# Altium footprint library Connectors.PcbLib: 408 footprints (part 6 of 26)
Each footprint in its own frame and in the unit in brackets; x right, y up, seen from the top. Pads: shape width x height; smd on the part's side, far side on the other; paste and mask are expansions set on the pad; w line width, h text height; cw(c..) or ccw(c..) is an arc to the next point about the centre after c.
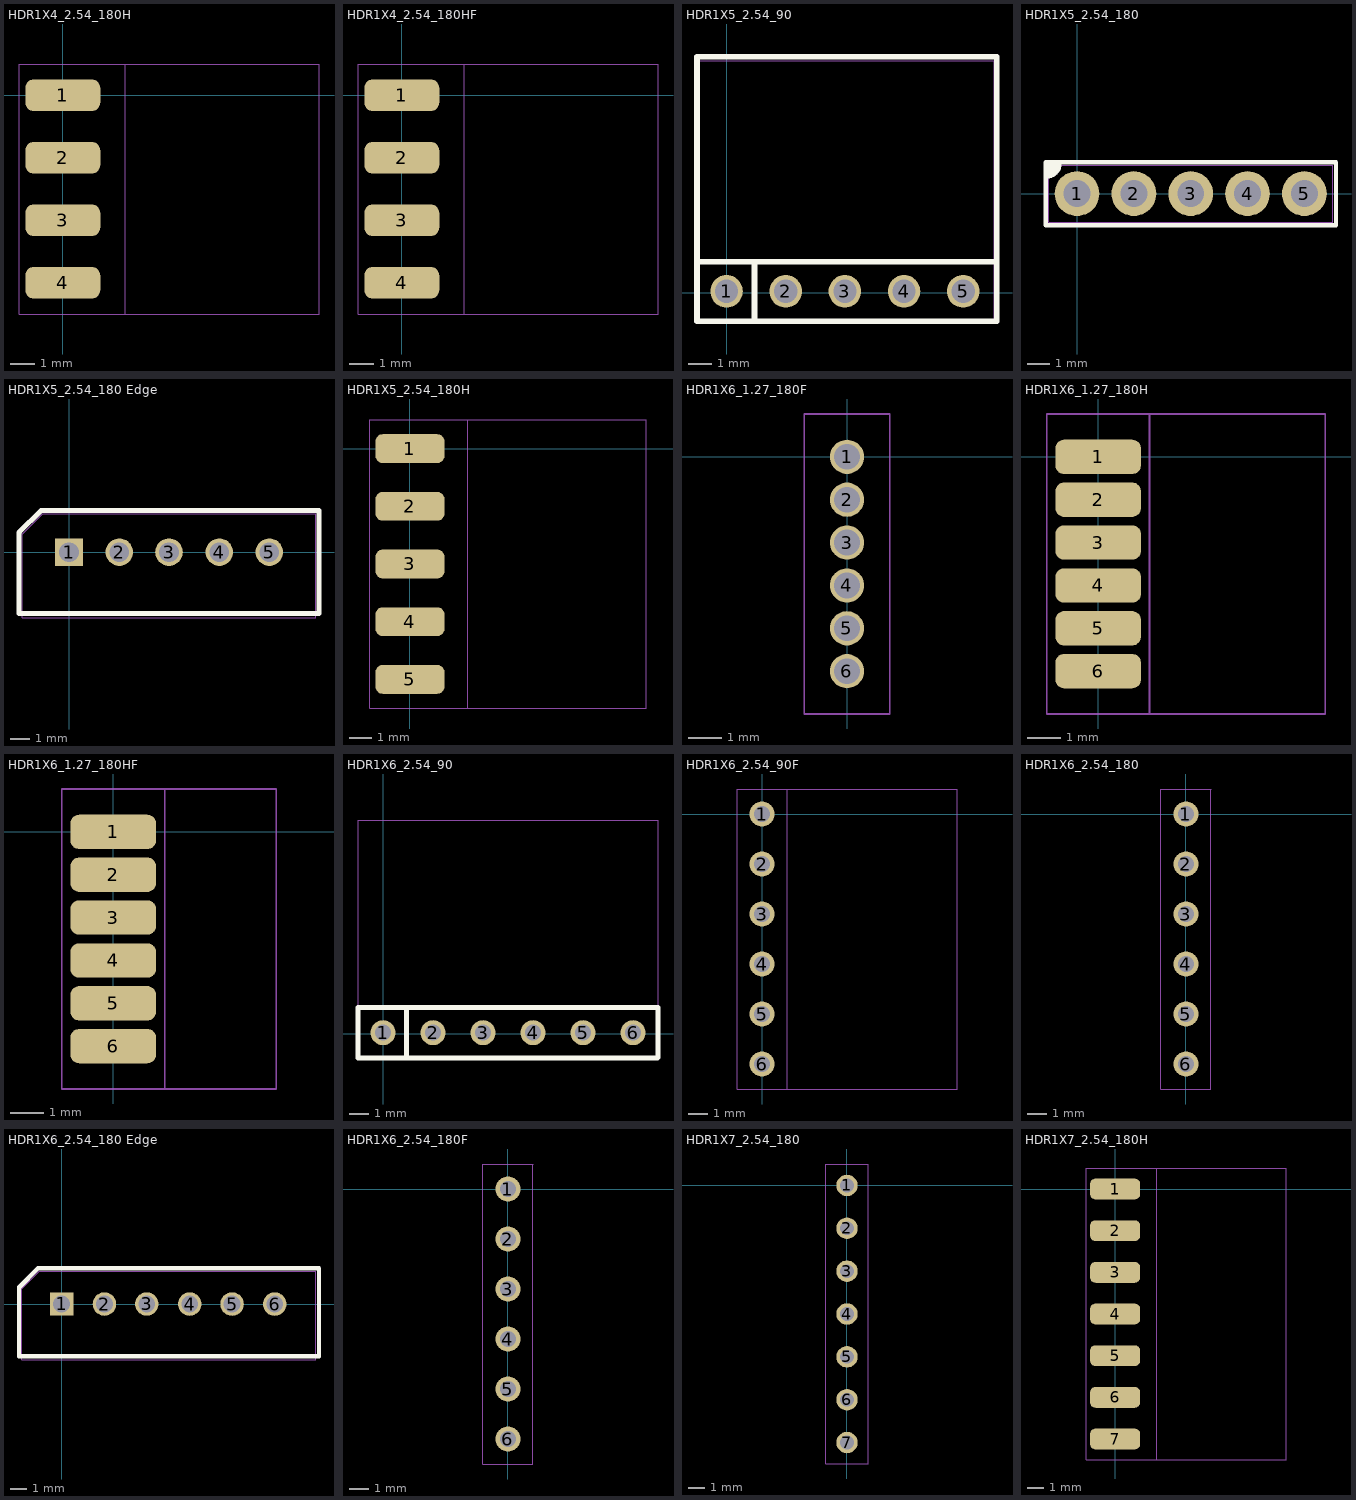
[diagram p5: the footprints below, top view; thin cyan lines are the x and y axes]

## HDR1X4_2.54_180H [mil]
height 169.29
pads (4):
  rrect50% 120x50 smd: 1(0,0) 2(0,-100) 3(0,-200) 4(0,-300)
Mechanical 13:
  lines w2: -70,-350 410,-350 410,50 -70,50 -70,-350
Mechanical 14:
  lines w2: -70,-350 -70,50 100,50 100,-350 -70,-350
  text ".Designator" at -31,-170 h80
3D body "pin_header_aw140-eg-g04d.stp": height 61.32, standoff -37.05, extent -35,-350 405.94,50

## HDR1X4_2.54_180HF [mil]
height 169.29
pads (4):
  rrect50% 120x50 smd: 1(0,0) 2(0,-100) 3(0,-200) 4(0,-300)
Mechanical 13:
  lines w2: -70,-350 -70,50 410,50 410,-350 -70,-350
Mechanical 14:
  lines w2: -70,-350 100,-350 100,50 -70,50 -70,-350
  text ".Designator" at -31,-170 h80

## HDR1X5_2.54_90 [mm]
height 4.3
pads (5):
  round 1.4 hole 1: 1(-0.015,0.053) 2(2.525,0.053) 3(5.065,0.053) 4(7.605,0.053) 5(10.145,0.053)
Top Overlay:
  lines w0.254: 1.183,-1.212 1.183,1.317 ; -1.282,1.316 -1.282,10.124 11.584,10.124 11.584,1.322 ; -1.282,1.316 -1.282,-1.234 11.584,-1.234 11.584,1.322 ; -1.282,1.316 -1.276,1.322 11.584,1.322
Mechanical 13:
  lines w0.051: -1.285,-1.217 -1.285,9.946 11.479,9.946 11.479,-1.217 -1.285,-1.217
Mechanical 14:
  lines w0.051: -1.285,-1.217 11.595,-1.217 11.595,1.323 -1.285,1.323 -1.285,-1.217
3D body "User Library-Header_Male_RA_Low_5Pin.STEP": height 3.78, standoff -1.73, extent -1.244,-0.23 11.456,9.9

## HDR1X5_2.54_180 [mm]
height 4.3
pads (5):
  round 2 hole 1.2: 1(0,0) 2(2.54,0) 3(5.08,0) 4(7.62,0) 5(10.16,0)
Top Overlay:
  region: -1.4,1.406 -0.9,1.406 -0.9,1.206 -1.2,0.906 -1.4,0.906
  lines w0.2: -1.4,-1.416 -1.4,1.406 11.573,1.406 11.573,-1.416 -1.4,-1.416
  lines w0.3: -1.334,0.828 ccw(c-1.334,1.328) -0.834,1.328
Mechanical 13:
  lines w0.051: -1.27,-1.27 -1.27,1.27 11.43,1.27 11.43,-1.27 -1.27,-1.27
3D body "pin_header_aw140-eg-g05d.stp": height 8.2, standoff -3, extent -1.27,-1.249 11.43,1.249

## HDR1X5_2.54_180 Edge [mm]
height 4.3
pads (5):
  rect 1.4x1.4 hole 1: 1(-0.014,0.001)
  round 1.4 hole 1: 2(2.54,0) 3(5.066,0.001) 4(7.62,0) 5(10.16,0)
Top Overlay:
  lines w0.254: -2.541,1.006 -1.422,2.125 -1.401,2.125 12.67,2.125 ; -2.554,-3.103 12.686,-3.103 12.686,2.119 -1.428,2.119 -2.554,1.014 -2.554,-3.103
Mechanical 13:
  lines w0.051: -2.385,-3.323 12.51,-3.323 12.51,1.95 -1.355,1.95 -2.385,0.92 -2.385,-3.323
3D body "JST B5B-XH-A.STEP": height 7, standoff -3.4, extent -2.38,-3.203 12.52,2.547

## HDR1X5_2.54_180H [mil]
height 169.29
pads (5):
  rrect50% 120x50 smd: 1(0,0) 2(0,-100) 3(0,-200) 4(0,-300) 5(0,-400)
Mechanical 13:
  lines w2: -70,-450 410,-450 410,50 -70,50 -70,-450
Mechanical 14:
  lines w2: -70,-450 -70,50 100,50 100,-450 -70,-450
  text ".Designator" at -31,-220 h80
3D body "pin_header_aw140-eg-g05d.stp": height 61.32, standoff -37.05, extent -35,-450 405.95,50

## HDR1X6_1.27_180F [mil]
height 169.29
pads (6):
  round 40 hole 30: 1(0,0) 2(0,-50) 3(0,-100) 4(0,-150) 5(0,-200) 6(0,-250)
Mechanical 13:
  lines w2: -50,-300 -50,50 50,50 50,-300 -50,-300
Mechanical 14:
  lines w2: -50,-300 -50,50 50,50 50,-300 -50,-300
  text ".Designator" at -31,-145 h80

## HDR1X6_1.27_180H [mil]
height 169.29
pads (6):
  rrect50% 100x40 smd: 1(0,0) 2(0,-50) 3(0,-100) 4(0,-150) 5(0,-200) 6(0,-250)
Mechanical 13:
  lines w2: -60,-300 -60,50 265,50 265,-300 -60,-300
Mechanical 14:
  lines w2: -60,-300 60,-300 60,50 -60,50 -60,-300
  text ".Designator" at -31,-145 h80
3D body "pin_header_a-sl127-eg-g06d.stp": height 49.21, standoff -49.21, extent -47.36,-274.99 265.24,25.01

## HDR1X6_1.27_180HF [mil]
height 169.29
pads (6):
  rrect50% 100x40 smd: 1(0,0) 2(0,-50) 3(0,-100) 4(0,-150) 5(0,-200) 6(0,-250)
Mechanical 13:
  lines w2: -60,-300 -60,50 190,50 190,-300 -60,-300
Mechanical 14:
  lines w2: -60,-300 60,-300 60,50 -60,50 -60,-300
  text ".Designator" at -31,-145 h80
3D body "female_header_a-bl127-eg-g06d.stp": height 71.43, standoff 0.57, extent -38.35,-282.88 190,32.88

## HDR1X6_2.54_90 [mil]
height 169.29
pads (6):
  round 50 hole 32: 1(-0.59,2.09) 2(99.41,2.09) 3(199.41,2.09) 4(299.41,2.09) 5(399.41,2.09) 6(499.41,2.09)
Top Overlay:
  lines w10: 46.57,-47.72 46.57,51.85 ; -50.47,-48.11 -50.47,51.81 -50.24,52.05 549.37,52.05 549.37,-47.2 548.46,-48.11 -50.47,-48.11
Mechanical 13:
  lines w2: -50.59,-47.91 -50.59,427.09 549.41,427.09 549.41,-47.91 -50.59,-47.91
Mechanical 14:
  lines w2: -50.59,-47.91 549.41,-47.91 549.41,52.09 -50.59,52.09 -50.59,-47.91
3D body "pin_header_aw140-ea-g06g.stp": height 99.21, standoff -93.7, extent -46.66,-12.88 545.47,425.71

## HDR1X6_2.54_90F [mil]
height 169.29
pads (6):
  round 50 hole 32: 1(0,0) 2(0,-100) 3(0,-200) 4(0,-300) 5(0,-400) 6(0,-500)
Mechanical 13:
  lines w2: -50,-550 -50,50 390,50 390,-550 -50,-550
Mechanical 14:
  lines w2: -50,-550 50,-550 50,50 -50,50 -50,-550
  text ".Designator" at -31,-270 h80
3D body "female_header_a-bl254-ea-g06d.stp": height 99.21, standoff -125.2, extent -10,-554.92 386.06,54.92

## HDR1X6_2.54_180 [mil]
height 169.29
pads (6):
  round 50 hole 32: 1(0,0) 2(0,-100) 3(0,-200) 4(0,-300) 5(0,-400) 6(0,-500)
Mechanical 13:
  lines w2: -50,-550 -50,50 50,50 50,-550 -50,-550
Mechanical 14:
  lines w2: -50,-550 -50,50 50,50 50,-550 -50,-550
  text ".Designator" at -31,-270 h80
3D body "pin_header_aw140-eg-g06d.stp": height 322.83, standoff -118.11, extent -49.18,-550 49.18,50

## HDR1X6_2.54_180 Edge [mm]
height 4.3
pads (6):
  rect 1.4x1.4 hole 1: 1(0.001,0.004)
  round 1.4 hole 1: 2(2.555,0.003) 3(5.081,0.004) 4(7.635,0.003) 5(10.16,0) 6(12.7,0)
Top Overlay:
  lines w0.254: -2.531,-3.117 15.326,-3.117 ; -2.528,1.004 -1.427,2.106 -1.4,2.136 15.325,2.136 ; -2.539,-3.118 -2.539,1.014 -1.403,2.129 15.34,2.129 15.34,-3.118 -2.539,-3.118
Mechanical 13:
  lines w0.051: -2.37,-3.32 -2.37,0.917 -1.323,1.964 15.156,1.964 15.156,-3.32 -2.37,-3.32
Mechanical 14:
  lines w0.051: -2.366,-3.317 -2.366,0.929 -1.331,1.964 15.161,1.964 15.161,-3.317 -2.366,-3.317
3D body "JST B6B-XH-A.STEP": height 7, standoff -3.4, extent -2.304,-3.247 15.096,2.503

## HDR1X6_2.54_180F [mil]
height 169.29
pads (6):
  round 50 hole 32: 1(0,0) 2(0,-100) 3(0,-200) 4(0,-300) 5(0,-400) 6(0,-500)
Mechanical 13:
  lines w2: -50,-550 50,-550 50,50 -50,50 -50,-550
Mechanical 14:
  lines w2: -50,-550 -50,50 50,50 50,-550 -50,-550
  text ".Designator" at -31,-270 h80
3D body "female_header_a-bl254-eg-g06d.stp": height 334.65, standoff -125.98, extent -49.21,-554.84 49.21,55

## HDR1X7_2.54_180 [mil]
height 169.29
pads (7):
  round 50 hole 32: 1(0,0) 2(0,-100) 3(0,-200) 4(0,-300) 5(0,-400) 6(0,-500) 7(0,-600)
Mechanical 13:
  lines w2: -50,-650 50,-650 50,50 -50,50 -50,-650
Mechanical 14:
  lines w2: -50,-650 50,-650 50,50 -50,50 -50,-650
  text ".Designator" at -31,-320 h80
3D body "pin_header_aw140-eg-g07d.stp": height 322.83, standoff -118.11, extent -49.18,-650 49.18,50

## HDR1X7_2.54_180H [mil]
height 169.29
pads (7):
  rrect50% 120x50 smd: 1(0,0) 2(0,-100) 3(0,-200) 4(0,-300) 5(0,-400) 6(0,-500) 7(0,-600)
Mechanical 13:
  lines w2: -70,-650 410,-650 410,50 -70,50 -70,-650
Mechanical 14:
  lines w2: -70,-650 -70,50 100,50 100,-650 -70,-650
  text ".Designator" at -31,-320 h80
3D body "pin_header_aw140-eg-g07d.stp": height 61.32, standoff -37.05, extent -35,-650 405.95,50